# Altium footprint library 3.22-杂项.PcbLib: 199 footprints (part 9 of 15)
Each footprint in its own frame and in the unit in brackets; x right, y up, seen from the top. Pads: shape width x height; smd on the part's side, far side on the other; paste and mask are expansions set on the pad; w line width, h text height; cw(c..) or ccw(c..) is an arc to the next point about the centre after c.
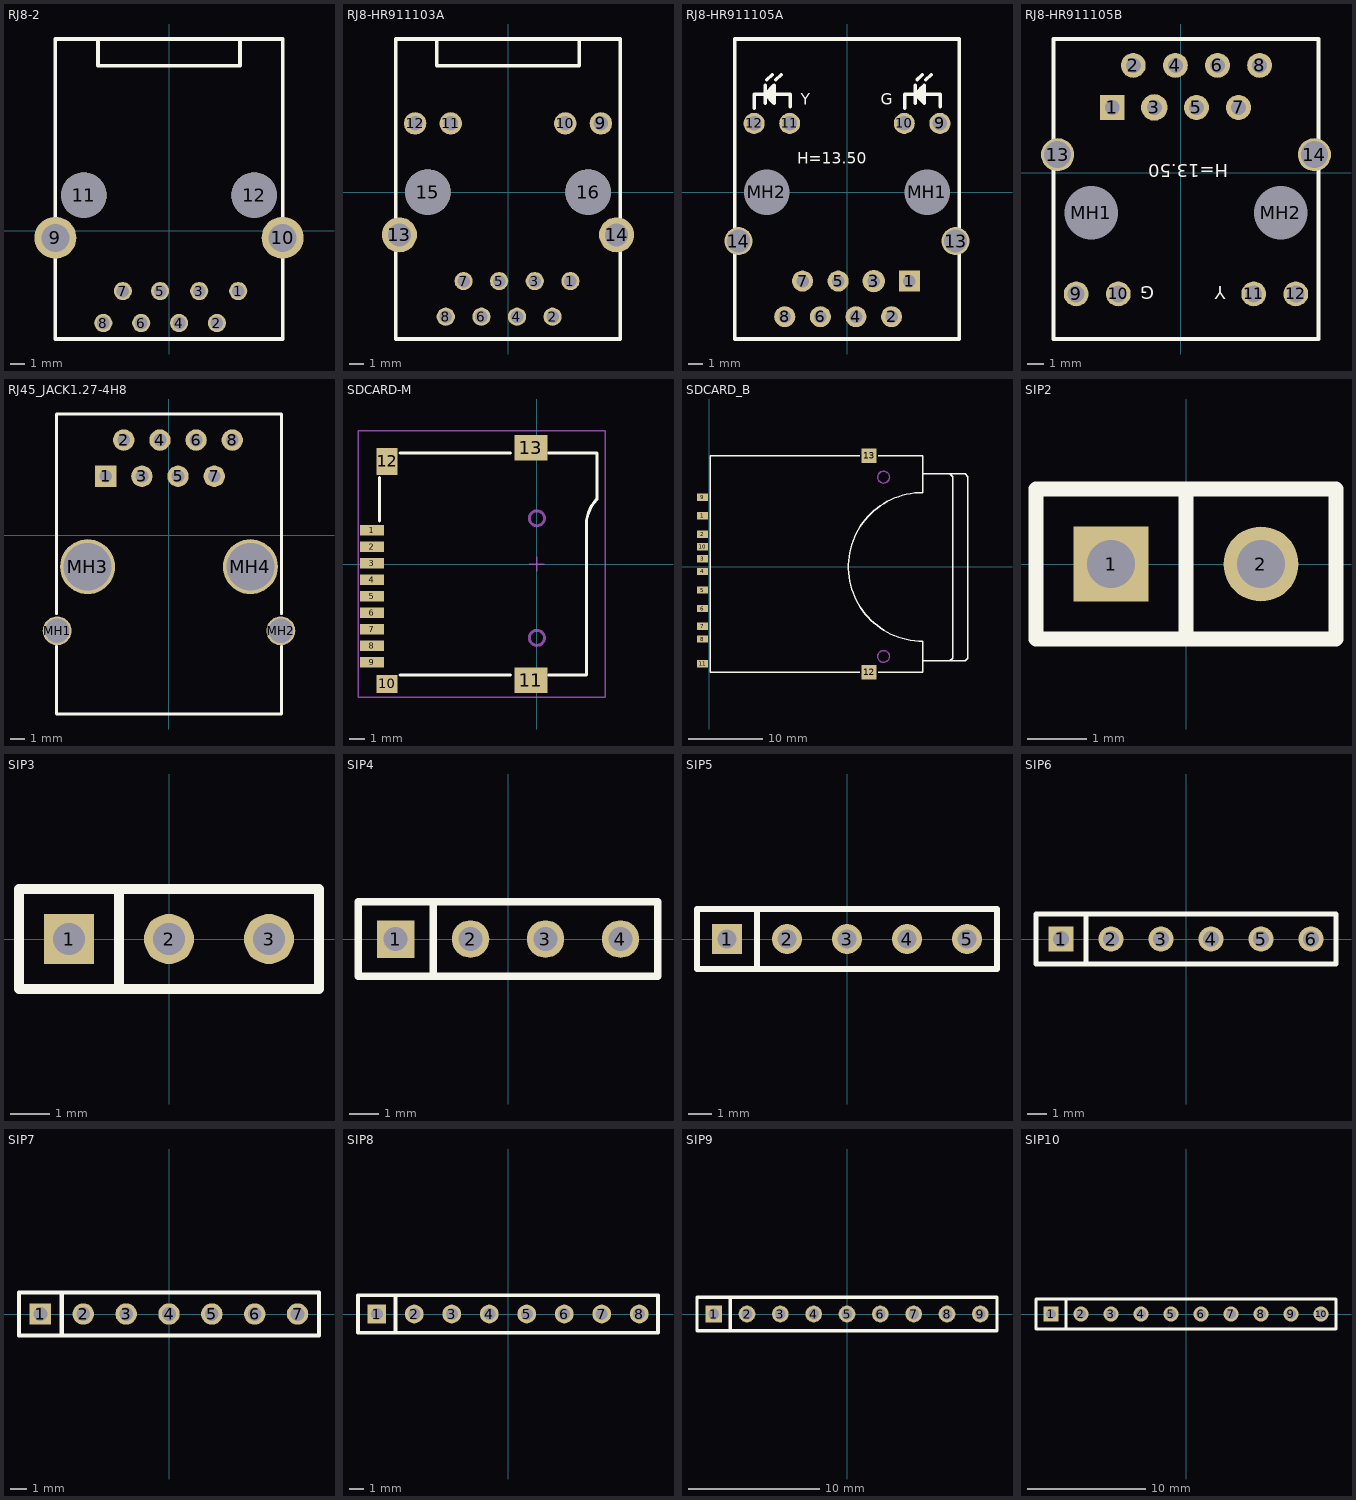
[diagram p8: the footprints below, top view; thin cyan lines are the x and y axes]

## RJ8-2 [mm] "网络      [ PCB学习群514746572 ]"
height 10
pads (12):
  round 1.3 hole 0.9: 1(4.953,-4.318) 2(3.429,-6.604) 3(2.159,-4.318) 4(0.72,-6.604) 5(-0.635,-4.318) 6(-1.99,-6.604) 7(-3.302,-4.318) 8(-4.699,-6.604)
  round 3 hole 2: 9(-8.128,-0.508) 10(8.128,-0.508)
  round 3.251 hole 3.251: 11(-6.096,2.54) 12(6.096,2.54)
Top Overlay:
  lines w0.254: -5.08,13.589 -5.08,11.811 5.08,11.811 5.08,13.589 ; -8.128,-7.747 8.128,-7.747 8.128,-0.889 8.128,13.716 -8.128,13.716 -8.128,-0.889 -8.128,-7.747

## RJ8-HR911103A [mm] "网络      [ PCB学习群514746572 ]"
height 10
pads (16):
  round 1.3 hole 0.9: 1(4.45,-6.35) 2(3.18,-8.89) 3(1.91,-6.35) 4(0.64,-8.89) 5(-0.63,-6.35) 6(-1.9,-8.89) 7(-3.17,-6.35) 8(-4.44,-8.89)
  round 1.6 hole 1.02: 9(6.625,4.9) 10(4.085,4.9) 11(-4.085,4.9) 12(-6.625,4.9)
  round 2.5 hole 1.63: 13(-7.745,-3.05) 14(7.745,-3.05)
  round 3.251 hole 3.251: 15(-5.715,0) 16(5.715,0)
Top Overlay:
  lines w0.254: -5.08,10.795 -5.08,9.017 5.08,9.017 5.08,10.795 ; -8,-10.48 -8,10.92 8,10.92 8,-10.48 -8,-10.48

## RJ8-HR911105A [mm] "[ PCBѧϰȺ514746572 ]"
height 14.8
pads (16):
  rect 1.5x1.5 hole 0.9: 1(4.45,-6.35)
  round 1.5 hole 0.9: 2(3.18,-8.89) 4(0.64,-8.89) 5(-0.63,-6.35) 6(-1.9,-8.89) 7(-3.17,-6.35) 8(-4.44,-8.89)
  round 1.6 hole 0.9: 3(1.91,-6.35)
  round 1.5 hole 1.02: 9(6.625,4.9) 10(4.085,4.9) 11(-4.085,4.9) 12(-6.625,4.9)
  round 2 hole 1.63: 13(7.745,-3.5) 14(-7.745,-3.5)
  round 2.95 hole 3.25 unplated: MH1(5.715,0) MH2(-5.715,0)
Top Overlay:
  lines w0.25: -6.604,5.969 -6.604,6.985 -4.064,6.985 -4.064,6.096 ; -5.842,6.35 -5.842,7.62 ; -5.715,8.001 -5.334,8.382 ; -5.434,6.592 -5.434,7.393 ; -5.08,8.001 -4.699,8.382 ; 4.106,5.969 4.106,6.985 6.646,6.985 6.646,6.096 ; 4.868,6.35 4.868,7.62 ; 4.995,8.001 5.376,8.382 ; 5.276,6.592 5.276,7.393 ; 5.63,8.001 6.011,8.382 ; -8,-10.48 8,-10.48 8,10.92 -8,10.92 -8,-10.48 ; -5.842,6.985 -5.207,6.35 -5.207,7.62 -5.842,6.985 ; 4.868,6.985 5.503,6.35 5.503,7.62 4.868,6.985
  text "H=13.50" at -3.556,2.032 h0.8
  text "Y" at -3.302,6.223 h0.8
  text "G" at 2.413,6.223 h0.8

## RJ8-HR911105B [mm] "[ PCBѧϰȺ514746572 ]"
height 14.8
pads (16):
  rect 1.5x1.5 hole 0.9: 1(-4.145,3.937)
  round 1.5 hole 0.9: 2(-2.875,6.477) 4(-0.335,6.477) 5(0.935,3.937) 6(2.205,6.477) 7(3.475,3.937) 8(4.745,6.477)
  round 1.6 hole 0.9: 3(-1.605,3.937)
  round 1.5 hole 1.02: 9(-6.32,-7.313) 10(-3.78,-7.313) 11(4.39,-7.313) 12(6.93,-7.313)
  round 2 hole 1.63: 13(-7.44,1.087) 14(8.05,1.087)
  round 2.95 hole 3.25 unplated: MH1(-5.41,-2.413) MH2(6.02,-2.413)
Top Overlay:
  lines w0.25: -7.695,-10.033 8.305,-10.033 8.305,8.067 -7.695,8.067 -7.695,-10.033
  text "H=13.50" at 2.845,0.508 h0.8
  text "Y" at 2.718,-6.858 h0.8
  text "G" at -1.6,-6.858 h0.8

## RJ45_JACK1.27-4H8 [mm] "RJ45 8芯 修改过的      [ PCB学习群514746572 ]"
pads (12):
  rect 1.5x1.5 hole 0.9: 1(-4.445,4.155)
  round 1.5 hole 0.9: 2(-3.175,6.695) 3(-1.905,4.155) 4(-0.635,6.695) 5(0.635,4.155) 6(1.905,6.695) 7(3.175,4.155) 8(4.445,6.695)
  round 2.032 hole 1.727: MH1(-7.849,-6.695) MH2(7.849,-6.695)
  round 3.861 hole 3.353: MH3(-5.715,-2.195) MH4(5.715,-2.195)
Top Overlay:
  lines w0.2: -7.9,-7.783 -7.9,-12.535 7.9,-12.535 7.9,-7.783 ; -7.9,-5.497 -7.9,8.525 7.9,8.525 7.9,-5.497

## SDCARD-M [mm] "TF卡      [ PCB学习群514746572 ]"
height 1.5
pads (13):
  rect 1.6x0.7 smd: 1(-11.008,2.25) 2(-11.008,1.15) 3(-11.008,0.05) 4(-11.008,-1.05) 5(-11.008,-2.15) 6(-11.008,-3.25) 7(-11.008,-4.35) 8(-11.008,-5.45) 9(-11.008,-6.55)
  rect 1.4x1.2 smd: 10(-10,-8.004)
  rect 2.2x1.7 smd: 11(-0.4,-7.75) 13(-0.4,7.75)
  rect 1.4x1.8 smd: 12(-10,6.85)
Top Overlay:
  lines w0.2: -10.5,2.88 -10.5,5.756 ; -9.144,-7.4 -1.778,-7.4 ; -9.144,7.4 -1.778,7.4 ; 0.762,-7.4 3.3,-7.4 3.3,1.016 ; 0.762,7.4 4,7.4 4,4.318 ccw(c5.69,2.628) 3.3,2.628 3.3,0.762
Mechanical 1:
  circle w0.2: c0,-4.93 r0.5
  circle w0.2: c0,3.05 r0.5
Mechanical 15:
  lines w0.1: -0.5,0 0.5,0 ; 0,-0.5 0,0.5 ; -11.938,-8.89 4.572,-8.89 4.572,8.89 -11.938,8.89 -11.938,-8.89

## SDCARD_B [mm] "SD卡自弹      [ PCB学习群514746572 ]"
pads (13):
  rect 1.5x1 smd: 1(-0.889,6.88) 2(-0.889,4.38) 3(-0.889,1.08) 4(-0.889,-0.63) 5(-0.889,-3.13) 6(-0.889,-5.63) 7(-0.889,-8.05) 8(-0.889,-9.75) 9(-0.889,9.38) 10(-0.889,2.73) 11(-0.889,-13.1)
  rect 2x2 smd: 12(21.59,-14.224) 13(21.59,14.986)
Top Overlay:
  lines w0.2: 20.32,-14.224 0.127,-14.224 0.127,0 0.127,14.986 20.32,14.986 ; 22.86,-14.224 28.829,-14.224 28.829,-10.033 cw(c28.829,0) 28.829,10.033 28.829,14.986 22.86,14.986 ; 28.829,-12.7 32.893,-12.7 34.544,-12.7 34.925,-12.319 34.925,12.192 34.544,12.573 32.893,12.573 28.829,12.573 ; 32.512,-12.7 32.893,-12.319 32.893,12.192 32.512,12.573
Mechanical 1:
  circle w0.2: c23.55,-12.1 r0.8
  circle w0.2: c23.55,12.1 r0.8

## SIP2 [mil] "[ PCBѧϰȺ514746572 ]"
pads (2):
  rect 50x50 hole 32: 1(-50,0)
  round 50 hole 32: 2(50,0)
Top Overlay:
  lines w10: 0,-50 0,50 ; -100,-50 -100,50 100,50 100,-50 -100,-50

## SIP3 [mil] "[ PCBѧϰȺ514746572 ]"
pads (3):
  rect 50x50 hole 32: 1(-100,0)
  round 50 hole 32: 2(0,0) 3(100,0)
Top Overlay:
  lines w10: -50,-50 -50,50 ; -150,-50 150,-50 150,50 -150,50 -150,-50

## SIP4 [mil] "[ PCBѧϰȺ514746572 ]"
pads (4):
  rect 50x50 hole 32: 1(-150,0)
  round 50 hole 32: 2(-50,0) 3(50,0) 4(150,0)
Top Overlay:
  lines w10: -100,-50 -100,50 ; -200,-50 -200,50 200,50 200,-50 -200,-50

## SIP5 [mil] "[ PCBѧϰȺ514746572 ]"
pads (5):
  rect 50x50 hole 32: 1(-200,0)
  round 50 hole 32: 2(-100,0) 3(0,0) 4(100,0) 5(200,0)
Top Overlay:
  lines w10: -150,-50 -150,50 ; -250,-50 250,-50 250,50 -250,50 -250,-50

## SIP6 [mil] "[ PCBѧϰȺ514746572 ]"
pads (6):
  rect 50x50 hole 32: 1(-250,0)
  round 50 hole 32: 2(-150,0) 3(-50,0) 4(50,0) 5(150,0) 6(250,0)
Top Overlay:
  lines w10: -200,-50 -200,50 ; -300,-50 -300,50 300,50 300,-50 -300,-50

## SIP7 [mil] "[ PCBѧϰȺ514746572 ]"
pads (7):
  rect 50x50 hole 32: 1(-300,0)
  round 50 hole 32: 2(-200,0) 3(-100,0) 4(0,0) 5(100,0) 6(200,0) 7(300,0)
Top Overlay:
  lines w10: -250,-50 -250,50 ; -350,-50 -350,50 350,50 350,-50 -350,-50

## SIP8 [mil] "[ PCBѧϰȺ514746572 ]"
pads (8):
  rect 50x50 hole 32: 1(-350,0)
  round 50 hole 32: 2(-250,0) 3(-150,0) 4(-50,0) 5(50,0) 6(150,0) 7(250,0) 8(350,0)
Top Overlay:
  lines w10: -300,-50 -300,50 ; -400,-50 400,-50 400,50 -400,50 -400,-50

## SIP9 [mil] "[ PCBѧϰȺ514746572 ]"
pads (9):
  rect 50x50 hole 32: 1(-400,0)
  round 50 hole 32: 2(-300,0) 3(-200,0) 4(-100,0) 5(0,0) 6(100,0) 7(200,0) 8(300,0) 9(400,0)
Top Overlay:
  lines w10: -350,-50 -350,50 ; -450,-50 -450,50 450,50 450,-50 -450,-50

## SIP10 [mil] "[ PCBѧϰȺ514746572 ]"
pads (10):
  rect 50x50 hole 32: 1(-450,0)
  round 50 hole 32: 2(-350,0) 3(-250,0) 4(-150,0) 5(-50,0) 6(50,0) 7(150,0) 8(250,0) 9(350,0) 10(450,0)
Top Overlay:
  lines w10: -400,-50 -400,50 ; -500,-50 -500,50 500,50 500,-50 -500,-50